# Altium footprint library Connectors.PcbLib: 229 footprints (part 10 of 15)
Each footprint in its own frame and in the unit in brackets; x right, y up, seen from the top. Pads: shape width x height; smd on the part's side, far side on the other; paste and mask are expansions set on the pad; w line width, h text height; cw(c..) or ccw(c..) is an arc to the next point about the centre after c.
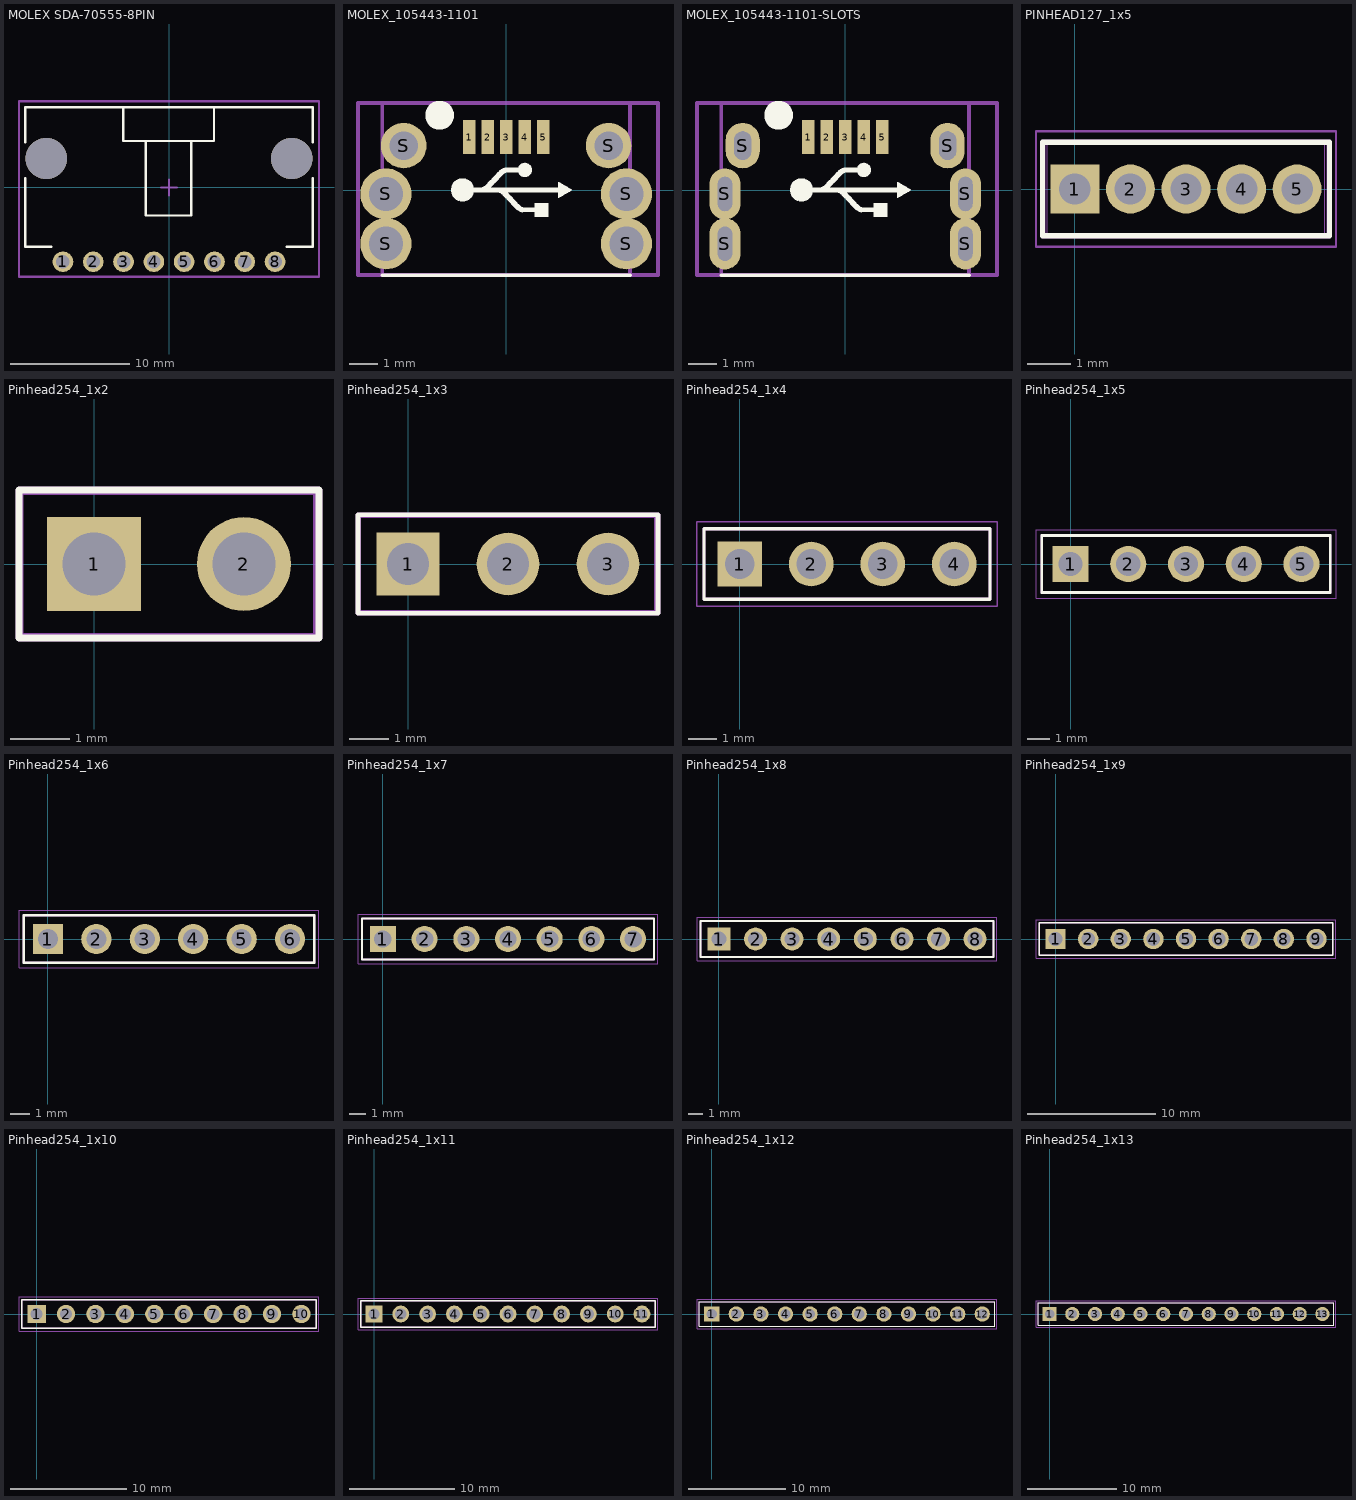
[diagram p9: the footprints below, top view; thin cyan lines are the x and y axes]

## MOLEX SDA-70555-8PIN [mm] "SL Right Angle Header W/LAtch & Trip-Pegs 2.54mm Centres"
height 6.99
pads (8):
  round 1.73 hole 1.13: 1(-8.89,-6.223) 2(-6.35,-6.223) 3(-3.81,-6.223) 4(-1.27,-6.223) 5(1.27,-6.223) 6(3.81,-6.223) 7(6.35,-6.223) 8(8.89,-6.223)
via 10.29,2.417 diameter 3.45 hole 3.45
via -10.29,2.417 diameter 3.45 hole 3.45
Top Overlay:
  lines w0.2: -12.05,0.777 -12.05,-4.953 -9.85,-4.953 ; -12.05,3.777 -12.05,6.731 12.05,6.731 12.05,3.777 ; -3.85,6.731 -3.85,3.892 3.77,3.892 3.77,6.731 ; -1.945,3.892 -1.945,-2.346 1.865,-2.346 1.865,3.892 ; 9.85,-4.953 12.05,-4.953 12.05,0.777
Mechanical 15:
  lines w0.2: -0.635,0 0.635,0 ; 0,-0.635 0,0.635 ; -12.573,-7.493 12.573,-7.493 12.573,7.239 -12.573,7.239 -12.573,-7.493
3D body: height 6.98, standoff -3.3, extent -12.065,-6.923 12.065,6.666

## MOLEX_105443-1101 [mm] "WATERPROOF MICRO USB TOP MNT FLNGLS"
height 4.013
pads (11):
  rect 0.45x1.2 smd: 1(-1.3,1.875) 2(-0.65,1.875) 3(0,1.875) 4(0.65,1.875) 5(1.3,1.875)
  round 1.8 hole 1.2: S(-4.225,-1.875) S(-4.225,-0.125) S(4.225,-1.875) S(4.225,-0.125)
  round 1.6 hole 1: S(-3.6,1.575) S(3.6,1.575)
Top Overlay:
  drawing of 3 lines, arcs and shapes, not listed
Mechanical 8:
  lines w0.127: -4.35,-2.975 -4.35,3.075 4.35,3.075 4.35,-2.975 -4.35,-2.975
  text ".Designator" at -3.277,-2.413 h1.14
Mechanical 15:
  lines w0.127: -5.207,-2.972 5.334,-2.972 5.334,3.073 -5.207,3.073 -5.207,-2.972
3D body: height 4.08, standoff -0.87, extent -4.65,-4.856 4.65,2.144

## MOLEX_105443-1101-SLOTS [mm] "WATERPROOF MICRO USB TOP MNT FLNGLS"
height 4.013
pads (11):
  rect 0.45x1.2 smd: 1(-1.3,1.875) 2(-0.65,1.875) 3(0,1.875) 4(0.65,1.875) 5(1.3,1.875)
  oval 1.1x1.8 hole 0.5 slot 1.2 at 90 deg: S(-4.225,-1.875) S(-4.225,-0.125) S(4.225,-1.875) S(4.225,-0.125)
  oval 1.2x1.6 hole 0.6 slot 1 at 90 deg: S(-3.6,1.575) S(3.6,1.575)
Top Overlay:
  drawing of 3 lines, arcs and shapes, not listed
Mechanical 1:
  lines w0.025: -4.478,-2.233 ccw(c-4.225,-2.233) -3.972,-2.233 -3.972,-1.517 ccw(c-4.225,-1.517) -4.478,-1.517 -4.478,-2.233 ; -4.478,-0.483 ccw(c-4.225,-0.483) -3.972,-0.483 -3.972,0.233 ccw(c-4.225,0.233) -4.478,0.233 -4.478,-0.483 ; -3.9,1.375 ccw(c-3.6,1.375) -3.3,1.375 -3.3,1.778 ccw(c-3.6,1.778) -3.9,1.778 -3.9,1.375 ; 3.3,1.375 ccw(c3.6,1.375) 3.9,1.375 3.9,1.778 ccw(c3.6,1.778) 3.3,1.778 3.3,1.375 ; 3.972,-2.233 ccw(c4.225,-2.233) 4.478,-2.233 4.478,-1.517 ccw(c4.225,-1.517) 3.972,-1.517 3.972,-2.233 ; 3.972,-0.483 ccw(c4.225,-0.483) 4.478,-0.483 4.478,0.233 ccw(c4.225,0.233) 3.972,0.233 3.972,-0.483
Mechanical 8:
  lines w0.127: -4.35,-2.975 4.35,-2.975 4.35,3.075 -4.35,3.075 -4.35,-2.975
  text ".Designator" at -3.277,-2.413 h1.14
Mechanical 15:
  lines w0.127: -5.207,-2.972 -5.207,3.073 5.334,3.073 5.334,-2.972 -5.207,-2.972
3D body: height 4.08, standoff -0.87, extent -4.65,-4.856 4.65,2.144

## PINHEAD127_1x5 [mm] "1.27mm pitch pin header"
height 4
pads (5):
  rect 1.12x1.12 hole 0.72: 1(0,0)
  round 1.12 hole 0.72: 2(1.27,0) 3(2.54,0) 4(3.81,0) 5(5.08,0)
Top Overlay:
  lines w0.12: -0.74,-1.07 -0.74,1.07 5.82,1.07 5.82,-1.07 -0.74,-1.07
Mechanical 8:
  lines w0.12: -0.737,-1.07 -0.737,1.07 5.817,1.07 5.817,-1.07 -0.737,-1.07
  text ".designator" at -0.33,-0.711 h1.27
Mechanical 13:
  lines w0.025: -0.635,-1.07 -0.635,1.07 5.715,1.07 5.715,-1.07 -0.635,-1.07 ; -0.2,-0.2 -0.2,0.2 0.2,0.2 0.2,-0.2 -0.2,-0.2 ; 1.07,-0.2 1.07,0.2 1.47,0.2 1.47,-0.2 1.07,-0.2 ; 2.34,-0.2 2.34,0.2 2.74,0.2 2.74,-0.2 2.34,-0.2 ; 3.61,-0.2 3.61,0.2 4.01,0.2 4.01,-0.2 3.61,-0.2 ; 4.88,-0.2 4.88,0.2 5.28,0.2 5.28,-0.2 4.88,-0.2
Mechanical 15:
  circle w0.05: c0,0 r0.25
  lines w0.05: -0.35,0 0.35,0 ; 0,-0.35 0,0.35 ; -0.89,-1.32 -0.89,1.32 5.97,1.32 5.97,-1.32 -0.89,-1.32
3D body: height 4, standoff -2.3, extent -0.635,-1.07 5.715,1.07

## Pinhead254_1x2 [mm]
height 8.79
pads (2):
  rect 1.59x1.59 hole 1.06: 1(0,0)
  round 1.59 hole 1.06: 2(2.54,0)
Top Overlay:
  lines w0.12: -1.27,-1.25 -1.27,1.25 3.81,1.25 3.81,-1.25 -1.27,-1.25
Mechanical 8:
  lines w0.12: -1.27,-1.25 -1.27,1.25 3.81,1.25 3.81,-1.25 -1.27,-1.25
Mechanical 13:
  lines w0.025: -1.27,-1.25 -1.27,1.25 3.81,1.25 3.81,-1.25 -1.27,-1.25 ; -0.32,-0.32 -0.32,0.32 0.32,0.32 0.32,-0.32 -0.32,-0.32 ; 2.22,-0.32 2.22,0.32 2.86,0.32 2.86,-0.32 2.22,-0.32
Mechanical 15:
  circle w0.05: c0,0 r0.25
  lines w0.05: -0.35,0 0.35,0 ; 0,-0.35 0,0.35 ; -1.219,-1.194 -1.219,1.194 3.734,1.194 3.734,-1.194 -1.219,-1.194
3D body: height 8.79, standoff -2.3, extent -1.27,-1.25 3.81,1.25

## Pinhead254_1x3 [mm]
height 8.79
pads (3):
  rect 1.59x1.59 hole 1.06: 1(0,0)
  round 1.59 hole 1.06: 2(2.54,0) 3(5.08,0)
Top Overlay:
  lines w0.12: -1.27,-1.25 6.35,-1.25 6.35,1.25 -1.27,1.25 -1.27,-1.25
Mechanical 8:
  lines w0.12: -1.27,-1.25 6.35,-1.25 6.35,1.25 -1.27,1.25 -1.27,-1.25
Mechanical 13:
  lines w0.025: -1.27,-1.25 6.35,-1.25 6.35,1.25 -1.27,1.25 -1.27,-1.25 ; -0.32,-0.32 0.32,-0.32 0.32,0.32 -0.32,0.32 -0.32,-0.32 ; 2.22,-0.32 2.86,-0.32 2.86,0.32 2.22,0.32 2.22,-0.32 ; 4.76,-0.32 5.4,-0.32 5.4,0.32 4.76,0.32 4.76,-0.32
Mechanical 15:
  circle w0.05: c0,0 r0.25
  lines w0.05: -0.35,0 0.35,0 ; 0,-0.35 0,0.35 ; -1.219,-1.194 6.274,-1.194 6.274,1.194 -1.219,1.194 -1.219,-1.194
3D body: height 8.79, standoff -2.3, extent -1.27,-1.25 6.35,1.25

## Pinhead254_1x4 [mm]
height 8.79
pads (4):
  rect 1.59x1.59 hole 1.06: 1(0,0)
  round 1.59 hole 1.06: 2(2.54,0) 3(5.08,0) 4(7.62,0)
Top Overlay:
  lines w0.12: -1.27,-1.25 -1.27,1.25 8.89,1.25 8.89,-1.25 -1.27,-1.25
Mechanical 8:
  lines w0.12: -1.27,-1.25 -1.27,1.25 8.89,1.25 8.89,-1.25 -1.27,-1.25
Mechanical 13:
  lines w0.025: -1.27,-1.25 -1.27,1.25 8.89,1.25 8.89,-1.25 -1.27,-1.25 ; -0.32,-0.32 -0.32,0.32 0.32,0.32 0.32,-0.32 -0.32,-0.32 ; 2.22,-0.32 2.22,0.32 2.86,0.32 2.86,-0.32 2.22,-0.32 ; 4.76,-0.32 4.76,0.32 5.4,0.32 5.4,-0.32 4.76,-0.32 ; 7.3,-0.32 7.3,0.32 7.94,0.32 7.94,-0.32 7.3,-0.32
Mechanical 15:
  circle w0.05: c0,0 r0.25
  lines w0.05: -0.35,0 0.35,0 ; 0,-0.35 0,0.35 ; -1.52,-1.5 -1.52,1.5 9.14,1.5 9.14,-1.5 -1.52,-1.5
3D body: height 8.79, standoff -2.3, extent -1.27,-1.25 8.89,1.25

## Pinhead254_1x5 [mm]
height 8.79
pads (5):
  rect 1.59x1.59 hole 1.06: 1(0,0)
  round 1.59 hole 1.06: 2(2.54,0) 3(5.08,0) 4(7.62,0) 5(10.16,0)
Top Overlay:
  lines w0.12: -1.27,-1.25 -1.27,1.25 11.43,1.25 11.43,-1.25 -1.27,-1.25
Mechanical 8:
  lines w0.12: -1.27,-1.25 -1.27,1.25 11.43,1.25 11.43,-1.25 -1.27,-1.25
  text ".designator" at -0.864,-0.889 h1.27
Mechanical 13:
  lines w0.025: -1.27,-1.25 -1.27,1.25 11.43,1.25 11.43,-1.25 -1.27,-1.25 ; -0.32,-0.32 -0.32,0.32 0.32,0.32 0.32,-0.32 -0.32,-0.32 ; 2.22,-0.32 2.22,0.32 2.86,0.32 2.86,-0.32 2.22,-0.32 ; 4.76,-0.32 4.76,0.32 5.4,0.32 5.4,-0.32 4.76,-0.32 ; 7.3,-0.32 7.3,0.32 7.94,0.32 7.94,-0.32 7.3,-0.32 ; 9.84,-0.32 9.84,0.32 10.48,0.32 10.48,-0.32 9.84,-0.32
Mechanical 15:
  circle w0.05: c0,0 r0.25
  lines w0.05: -0.35,0 0.35,0 ; 0,-0.35 0,0.35 ; -1.52,-1.5 -1.52,1.5 11.68,1.5 11.68,-1.5 -1.52,-1.5
3D body: height 8.79, standoff -2.3, extent -1.27,-1.25 11.43,1.25

## Pinhead254_1x6 [mm]
height 8.79
pads (6):
  rect 1.59x1.59 hole 1.06: 1(0,0)
  round 1.59 hole 1.06: 2(2.54,0) 3(5.08,0) 4(7.62,0) 5(10.16,0) 6(12.7,0)
Top Overlay:
  lines w0.12: -1.27,-1.25 -1.27,1.25 13.97,1.25 13.97,-1.25 -1.27,-1.25
Mechanical 8:
  lines w0.12: -1.27,-1.25 -1.27,1.25 13.97,1.25 13.97,-1.25 -1.27,-1.25
Mechanical 13:
  lines w0.025: -1.27,-1.25 -1.27,1.25 13.97,1.25 13.97,-1.25 -1.27,-1.25 ; -0.32,-0.32 -0.32,0.32 0.32,0.32 0.32,-0.32 -0.32,-0.32 ; 2.22,-0.32 2.22,0.32 2.86,0.32 2.86,-0.32 2.22,-0.32 ; 4.76,-0.32 4.76,0.32 5.4,0.32 5.4,-0.32 4.76,-0.32 ; 7.3,-0.32 7.3,0.32 7.94,0.32 7.94,-0.32 7.3,-0.32 ; 9.84,-0.32 9.84,0.32 10.48,0.32 10.48,-0.32 9.84,-0.32 ; 12.38,-0.32 12.38,0.32 13.02,0.32 13.02,-0.32 12.38,-0.32
Mechanical 15:
  circle w0.05: c0,0 r0.25
  lines w0.05: -0.35,0 0.35,0 ; 0,-0.35 0,0.35 ; -1.52,-1.5 -1.52,1.5 14.22,1.5 14.22,-1.5 -1.52,-1.5
3D body: height 8.79, standoff -2.3, extent -1.27,-1.25 13.97,1.25

## Pinhead254_1x7 [mm]
height 8.79
pads (7):
  rect 1.59x1.59 hole 1.06: 1(0,0)
  round 1.59 hole 1.06: 2(2.54,0) 3(5.08,0) 4(7.62,0) 5(10.16,0) 6(12.7,0) 7(15.24,0)
Top Overlay:
  lines w0.12: -1.27,-1.25 -1.27,1.25 16.51,1.25 16.51,-1.25 -1.27,-1.25
Mechanical 8:
  lines w0.12: -1.27,-1.25 -1.27,1.25 16.51,1.25 16.51,-1.25 -1.27,-1.25
Mechanical 13:
  lines w0.025: -1.27,-1.25 -1.27,1.25 16.51,1.25 16.51,-1.25 -1.27,-1.25 ; -0.32,-0.32 -0.32,0.32 0.32,0.32 0.32,-0.32 -0.32,-0.32 ; 2.22,-0.32 2.22,0.32 2.86,0.32 2.86,-0.32 2.22,-0.32 ; 4.76,-0.32 4.76,0.32 5.4,0.32 5.4,-0.32 4.76,-0.32 ; 7.3,-0.32 7.3,0.32 7.94,0.32 7.94,-0.32 7.3,-0.32 ; 9.84,-0.32 9.84,0.32 10.48,0.32 10.48,-0.32 9.84,-0.32 ; 12.38,-0.32 12.38,0.32 13.02,0.32 13.02,-0.32 12.38,-0.32 ; 14.92,-0.32 14.92,0.32 15.56,0.32 15.56,-0.32 14.92,-0.32
Mechanical 15:
  circle w0.05: c0,0 r0.25
  lines w0.05: -0.35,0 0.35,0 ; 0,-0.35 0,0.35 ; -1.52,-1.5 -1.52,1.5 16.76,1.5 16.76,-1.5 -1.52,-1.5
3D body: height 8.79, standoff -2.3, extent -1.27,-1.25 16.51,1.25

## Pinhead254_1x8 [mm]
height 8.79
pads (8):
  rect 1.59x1.59 hole 1.06: 1(0,0)
  round 1.59 hole 1.06: 2(2.54,0) 3(5.08,0) 4(7.62,0) 5(10.16,0) 6(12.7,0) 7(15.24,0) 8(17.78,0)
Top Overlay:
  lines w0.12: -1.27,-1.25 -1.27,1.25 19.05,1.25 19.05,-1.25 -1.27,-1.25
Mechanical 8:
  lines w0.12: -1.27,-1.25 -1.27,1.25 19.05,1.25 19.05,-1.25 -1.27,-1.25
Mechanical 13:
  lines w0.025: -1.27,-1.25 -1.27,1.25 19.05,1.25 19.05,-1.25 -1.27,-1.25 ; -0.32,-0.32 -0.32,0.32 0.32,0.32 0.32,-0.32 -0.32,-0.32 ; 2.22,-0.32 2.22,0.32 2.86,0.32 2.86,-0.32 2.22,-0.32 ; 4.76,-0.32 4.76,0.32 5.4,0.32 5.4,-0.32 4.76,-0.32 ; 7.3,-0.32 7.3,0.32 7.94,0.32 7.94,-0.32 7.3,-0.32 ; 9.84,-0.32 9.84,0.32 10.48,0.32 10.48,-0.32 9.84,-0.32 ; 12.38,-0.32 12.38,0.32 13.02,0.32 13.02,-0.32 12.38,-0.32 ; 14.92,-0.32 14.92,0.32 15.56,0.32 15.56,-0.32 14.92,-0.32 ; 17.46,-0.32 17.46,0.32 18.1,0.32 18.1,-0.32 17.46,-0.32
Mechanical 15:
  circle w0.05: c0,0 r0.25
  lines w0.05: -0.35,0 0.35,0 ; 0,-0.35 0,0.35 ; -1.52,-1.5 -1.52,1.5 19.3,1.5 19.3,-1.5 -1.52,-1.5
3D body: height 8.79, standoff -2.3, extent -1.27,-1.25 19.05,1.25

## Pinhead254_1x9 [mm]
height 8.79
pads (9):
  rect 1.59x1.59 hole 1.06: 1(0,0)
  round 1.59 hole 1.06: 2(2.54,0) 3(5.08,0) 4(7.62,0) 5(10.16,0) 6(12.7,0) 7(15.24,0) 8(17.78,0) 9(20.32,0)
Top Overlay:
  lines w0.12: -1.27,-1.25 -1.27,1.25 21.59,1.25 21.59,-1.25 -1.27,-1.25
Mechanical 8:
  lines w0.12: -1.27,-1.25 -1.27,1.25 21.59,1.25 21.59,-1.25 -1.27,-1.25
Mechanical 13:
  lines w0.025: -1.27,-1.25 -1.27,1.25 21.59,1.25 21.59,-1.25 -1.27,-1.25 ; -0.32,-0.32 -0.32,0.32 0.32,0.32 0.32,-0.32 -0.32,-0.32 ; 2.22,-0.32 2.22,0.32 2.86,0.32 2.86,-0.32 2.22,-0.32 ; 4.76,-0.32 4.76,0.32 5.4,0.32 5.4,-0.32 4.76,-0.32 ; 7.3,-0.32 7.3,0.32 7.94,0.32 7.94,-0.32 7.3,-0.32 ; 9.84,-0.32 9.84,0.32 10.48,0.32 10.48,-0.32 9.84,-0.32 ; 12.38,-0.32 12.38,0.32 13.02,0.32 13.02,-0.32 12.38,-0.32 ; 14.92,-0.32 14.92,0.32 15.56,0.32 15.56,-0.32 14.92,-0.32 ; 17.46,-0.32 17.46,0.32 18.1,0.32 18.1,-0.32 17.46,-0.32 ; 20,-0.32 20,0.32 20.64,0.32 20.64,-0.32 20,-0.32
Mechanical 15:
  circle w0.05: c0,0 r0.25
  lines w0.05: -0.35,0 0.35,0 ; 0,-0.35 0,0.35 ; -1.52,-1.5 -1.52,1.5 21.84,1.5 21.84,-1.5 -1.52,-1.5
3D body: height 8.79, standoff -2.3, extent -1.27,-1.25 21.59,1.25

## Pinhead254_1x10 [mm]
height 8.79
pads (10):
  rect 1.59x1.59 hole 1.06: 1(0,0)
  round 1.59 hole 1.06: 2(2.54,0) 3(5.08,0) 4(7.62,0) 5(10.16,0) 6(12.7,0) 7(15.24,0) 8(17.78,0) 9(20.32,0) 10(22.86,0)
Top Overlay:
  lines w0.12: -1.27,-1.25 -1.27,1.25 24.13,1.25 24.13,-1.25 -1.27,-1.25
Mechanical 8:
  lines w0.12: -1.27,-1.25 -1.27,1.25 24.13,1.25 24.13,-1.25 -1.27,-1.25
Mechanical 13:
  lines w0.025: -1.27,-1.25 -1.27,1.25 24.13,1.25 24.13,-1.25 -1.27,-1.25 ; -0.32,-0.32 -0.32,0.32 0.32,0.32 0.32,-0.32 -0.32,-0.32 ; 2.22,-0.32 2.22,0.32 2.86,0.32 2.86,-0.32 2.22,-0.32 ; 4.76,-0.32 4.76,0.32 5.4,0.32 5.4,-0.32 4.76,-0.32 ; 7.3,-0.32 7.3,0.32 7.94,0.32 7.94,-0.32 7.3,-0.32 ; 9.84,-0.32 9.84,0.32 10.48,0.32 10.48,-0.32 9.84,-0.32 ; 12.38,-0.32 12.38,0.32 13.02,0.32 13.02,-0.32 12.38,-0.32 ; 14.92,-0.32 14.92,0.32 15.56,0.32 15.56,-0.32 14.92,-0.32 ; 17.46,-0.32 17.46,0.32 18.1,0.32 18.1,-0.32 17.46,-0.32 ; 20,-0.32 20,0.32 20.64,0.32 20.64,-0.32 20,-0.32 ; 22.54,-0.32 22.54,0.32 23.18,0.32 23.18,-0.32 22.54,-0.32
Mechanical 15:
  circle w0.05: c0,0 r0.25
  lines w0.05: -0.35,0 0.35,0 ; 0,-0.35 0,0.35 ; -1.52,-1.5 -1.52,1.5 24.38,1.5 24.38,-1.5 -1.52,-1.5
3D body: height 8.79, standoff -2.3, extent -1.27,-1.25 24.13,1.25

## Pinhead254_1x11 [mm]
height 8.79
pads (11):
  rect 1.59x1.59 hole 1.06: 1(0,0)
  round 1.59 hole 1.06: 2(2.54,0) 3(5.08,0) 4(7.62,0) 5(10.16,0) 6(12.7,0) 7(15.24,0) 8(17.78,0) 9(20.32,0) 10(22.86,0) 11(25.4,0)
Top Overlay:
  lines w0.12: -1.27,-1.25 -1.27,1.25 26.67,1.25 26.67,-1.25 -1.27,-1.25
Mechanical 8:
  lines w0.12: -1.27,-1.25 -1.27,1.25 26.67,1.25 26.67,-1.25 -1.27,-1.25
Mechanical 13:
  lines w0.025: -1.27,-1.25 -1.27,1.25 26.67,1.25 26.67,-1.25 -1.27,-1.25 ; -0.32,-0.32 -0.32,0.32 0.32,0.32 0.32,-0.32 -0.32,-0.32 ; 2.22,-0.32 2.22,0.32 2.86,0.32 2.86,-0.32 2.22,-0.32 ; 4.76,-0.32 4.76,0.32 5.4,0.32 5.4,-0.32 4.76,-0.32 ; 7.3,-0.32 7.3,0.32 7.94,0.32 7.94,-0.32 7.3,-0.32 ; 9.84,-0.32 9.84,0.32 10.48,0.32 10.48,-0.32 9.84,-0.32 ; 12.38,-0.32 12.38,0.32 13.02,0.32 13.02,-0.32 12.38,-0.32 ; 14.92,-0.32 14.92,0.32 15.56,0.32 15.56,-0.32 14.92,-0.32 ; 17.46,-0.32 17.46,0.32 18.1,0.32 18.1,-0.32 17.46,-0.32 ; 20,-0.32 20,0.32 20.64,0.32 20.64,-0.32 20,-0.32 ; 22.54,-0.32 22.54,0.32 23.18,0.32 23.18,-0.32 22.54,-0.32 ; 25.08,-0.32 25.08,0.32 25.72,0.32 25.72,-0.32 25.08,-0.32
Mechanical 15:
  circle w0.05: c0,0 r0.25
  lines w0.05: -0.35,0 0.35,0 ; 0,-0.35 0,0.35 ; -1.52,-1.5 -1.52,1.5 26.92,1.5 26.92,-1.5 -1.52,-1.5
3D body: height 8.79, standoff -2.3, extent -1.27,-1.25 26.67,1.25

## Pinhead254_1x12 [mm]
height 8.79
pads (12):
  rect 1.59x1.59 hole 1.06: 1(0,0)
  round 1.59 hole 1.06: 2(2.54,0) 3(5.08,0) 4(7.62,0) 5(10.16,0) 6(12.7,0) 7(15.24,0) 8(17.78,0) 9(20.32,0) 10(22.86,0) 11(25.4,0) 12(27.94,0)
Top Overlay:
  lines w0.12: -1.27,-1.25 29.21,-1.25 29.21,1.25 -1.27,1.25 -1.27,-1.25
Mechanical 8:
  lines w0.12: -1.27,-1.25 29.21,-1.25 29.21,1.25 -1.27,1.25 -1.27,-1.25
Mechanical 13:
  lines w0.025: -1.27,-1.25 29.21,-1.25 29.21,1.25 -1.27,1.25 -1.27,-1.25 ; -0.32,-0.32 0.32,-0.32 0.32,0.32 -0.32,0.32 -0.32,-0.32 ; 2.22,-0.32 2.86,-0.32 2.86,0.32 2.22,0.32 2.22,-0.32 ; 4.76,-0.32 5.4,-0.32 5.4,0.32 4.76,0.32 4.76,-0.32 ; 7.3,-0.32 7.94,-0.32 7.94,0.32 7.3,0.32 7.3,-0.32 ; 9.84,-0.32 10.48,-0.32 10.48,0.32 9.84,0.32 9.84,-0.32 ; 12.38,-0.32 13.02,-0.32 13.02,0.32 12.38,0.32 12.38,-0.32 ; 14.92,-0.32 15.56,-0.32 15.56,0.32 14.92,0.32 14.92,-0.32 ; 17.46,-0.32 18.1,-0.32 18.1,0.32 17.46,0.32 17.46,-0.32 ; 20,-0.32 20.64,-0.32 20.64,0.32 20,0.32 20,-0.32 ; 22.54,-0.32 23.18,-0.32 23.18,0.32 22.54,0.32 22.54,-0.32 ; 25.08,-0.32 25.72,-0.32 25.72,0.32 25.08,0.32 25.08,-0.32 ; 27.62,-0.32 28.26,-0.32 28.26,0.32 27.62,0.32 27.62,-0.32
Mechanical 15:
  circle w0.05: c0,0 r0.25
  lines w0.05: -0.35,0 0.35,0 ; 0,-0.35 0,0.35 ; -1.52,-1.5 29.46,-1.5 29.46,1.5 -1.52,1.5 -1.52,-1.5
3D body: height 8.79, standoff -2.3, extent -1.27,-1.25 29.21,1.25

## Pinhead254_1x13 [mm]
height 8.79
pads (13):
  rect 1.59x1.59 hole 1.06: 1(0,0)
  round 1.59 hole 1.06: 2(2.54,0) 3(5.08,0) 4(7.62,0) 5(10.16,0) 6(12.7,0) 7(15.24,0) 8(17.78,0) 9(20.32,0) 10(22.86,0) 11(25.4,0) 12(27.94,0) 13(30.48,0)
Top Overlay:
  lines w0.12: -1.27,-1.25 -1.27,1.25 31.75,1.25 31.75,-1.25 -1.27,-1.25
Mechanical 8:
  lines w0.12: -1.27,-1.25 -1.27,1.25 31.75,1.25 31.75,-1.25 -1.27,-1.25
Mechanical 13:
  lines w0.025: -1.27,-1.25 -1.27,1.25 31.75,1.25 31.75,-1.25 -1.27,-1.25 ; -0.32,-0.32 -0.32,0.32 0.32,0.32 0.32,-0.32 -0.32,-0.32 ; 2.22,-0.32 2.22,0.32 2.86,0.32 2.86,-0.32 2.22,-0.32 ; 4.76,-0.32 4.76,0.32 5.4,0.32 5.4,-0.32 4.76,-0.32 ; 7.3,-0.32 7.3,0.32 7.94,0.32 7.94,-0.32 7.3,-0.32 ; 9.84,-0.32 9.84,0.32 10.48,0.32 10.48,-0.32 9.84,-0.32 ; 12.38,-0.32 12.38,0.32 13.02,0.32 13.02,-0.32 12.38,-0.32 ; 14.92,-0.32 14.92,0.32 15.56,0.32 15.56,-0.32 14.92,-0.32 ; 17.46,-0.32 17.46,0.32 18.1,0.32 18.1,-0.32 17.46,-0.32 ; 20,-0.32 20,0.32 20.64,0.32 20.64,-0.32 20,-0.32 ; 22.54,-0.32 22.54,0.32 23.18,0.32 23.18,-0.32 22.54,-0.32 ; 25.08,-0.32 25.08,0.32 25.72,0.32 25.72,-0.32 25.08,-0.32 ; 27.62,-0.32 27.62,0.32 28.26,0.32 28.26,-0.32 27.62,-0.32 ; 30.16,-0.32 30.16,0.32 30.8,0.32 30.8,-0.32 30.16,-0.32
Mechanical 15:
  circle w0.05: c0,0 r0.25
  lines w0.05: -0.35,0 0.35,0 ; 0,-0.35 0,0.35 ; -1.52,-1.5 -1.52,1.5 32,1.5 32,-1.5 -1.52,-1.5
3D body: height 8.79, standoff -2.3, extent -1.27,-1.25 31.75,1.25